# Altium footprint library B38.PcbLib: 42 footprints (part 2 of 3)
Each footprint in its own frame and in the unit in brackets; x right, y up, seen from the top. Pads: shape width x height; smd on the part's side, far side on the other; paste and mask are expansions set on the pad; w line width, h text height; cw(c..) or ccw(c..) is an arc to the next point about the centre after c.
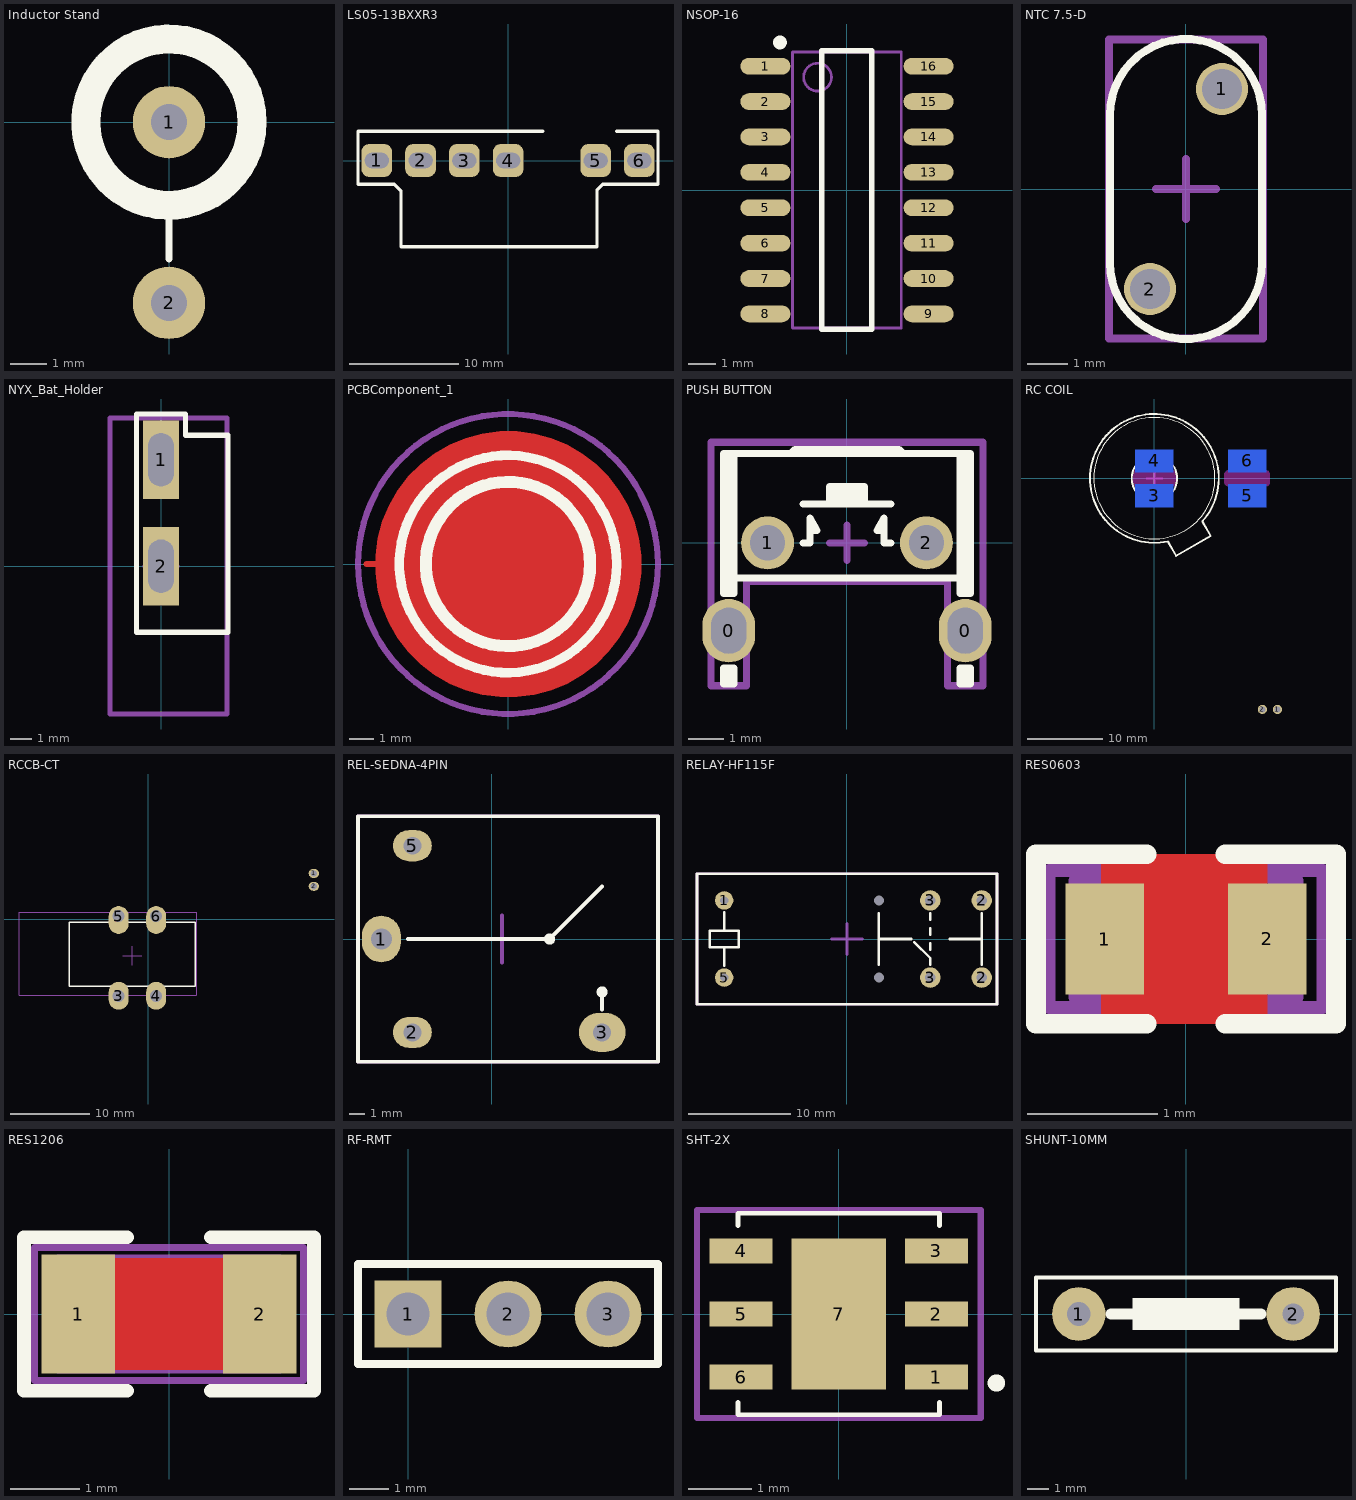
[diagram p1: the footprints below, top view; thin cyan lines are the x and y axes]

## Inductor Stand [mm]
pads (2):
  round 2 hole 1: 1(0,0) 2(0,-5)
Top Overlay:
  circle w0.8: c0,0 r2.3
  lines w0.2: 0,-3.785 0,-2.3

## LS05-13BXXR3 [mm]
pads (6):
  rrect50% 2.8x3 hole 1.4 slot 2.2 at 0 deg: 1(-12,0.005) 2(-8,0.005) 3(-4,-0.005) 4(0,-0.005) 5(8,-0.005) 6(12,-0.005)
Top Overlay:
  lines w0.3: 3.2,2.667 -13.716,2.667 -13.716,-2.159 -10.414,-2.159 -9.779,-2.794 -9.779,-7.874 8.128,-7.874 8.128,-2.667 8.636,-2.159 13.7,-2.159 13.7,2.667 9.9,2.667
3D body "PCB1.step": height 14.93, standoff -2.68, extent -13.287,-7.715 13.081,2.635

## NSOP-16 [mm]
pads (16):
  oval 1.8x0.6 smd: 1(-2.921,4.445) 2(-2.921,3.175) 3(-2.921,1.905) 4(-2.921,0.635) 5(-2.921,-0.635) 6(-2.921,-1.905) 7(-2.921,-3.175) 8(-2.921,-4.445) 9(2.933,-4.445) 10(2.932,-3.175) 11(2.933,-1.905) 12(2.933,-0.635) 13(2.933,0.635) 14(2.933,1.905) 15(2.932,3.175) 16(2.933,4.445)
Top Overlay:
  circle w0.25: c-2.399,5.295 r0.125
  lines w0.2: -0.9,-5 -0.9,5 0.901,5 0.901,-5 -0.9,-5
Mechanical 13:
  circle w0.1: c-1.05,4.05 r0.5
  lines w0.1: -1.95,-4.95 -1.95,4.95 1.95,4.95 1.95,-4.95 -1.95,-4.95
3D body "User Library-so16.STEP": height 1.7, standoff 0, extent -3.05,-5.125 2.95,5.075

## NTC 7.5-D [mm]
pads (2):
  round 1.3 / inner round 1.2 / far side oval 1.7x2 hole 1 mask+0.051: 1(0.9,2.5) 2(-0.9,-2.5)
Top Overlay:
  lines w0.2: -1.9,-1.85 ccw(c0,-1.85) 1.9,-1.85 1.9,1.85 ccw(c0,1.85) -1.9,1.85 -1.9,-1.8
Mechanical 15:
  lines w0.2: -0.75,0 0.75,0 ; 0,-0.75 0,0.75 ; -1.926,-3.743 -1.926,3.742 1.926,3.742 1.926,-3.743 -1.926,-3.743
3D body "Disk Varistor D7,5mm P5mm W4,5mm.stp": height 10.75, standoff -3.2, extent -1.926,-3.743 1.926,3.742

## NYX_Bat_Holder [mm]
height 2
pads (2):
  rect 1.7x3.7 / inner oval 1.7x3 / far side oval 2.3x3.6 hole 1.2 slot 2.5 at 90 deg: 1(0,5) 2(0,0)
Top Overlay:
  lines w0.25: -1.15,-3.1 -1.15,7.15 1.15,7.15 1.15,6.15 3.15,6.15 3.15,-3.1 -1.15,-3.1
Mechanical 15:
  lines w0.25: -0.75,0 0.75,0 ; 0,-0.75 0,0.75 ; -2.4,-6.948 3.1,-6.948 3.1,6.959 -2.4,6.959 -2.4,-6.948
3D body "BAT Holder_V5.step": height 15.5, standoff 0.51, extent -2.4,-6.948 3.1,6.959

## PCBComponent_1 [mm]
height 1.35
Top Layer:
  pour cut-out: -5.48,-0.008 -5.48,-0.369 -5.386,-1.083 -5.199,-1.779 -4.923,-2.444 -4.563,-3.068 -4.125,-3.639 -3.615,-4.149 -3.044,-4.587 -2.42,-4.947 -1.755,-5.223 -1.059,-5.41 -0.345,-5.504 0.376,-5.504 1.09,-5.41 1.786,-5.223 2.451,-4.947 3.075,-4.587 3.647,-4.149 4.156,-3.639 4.594,-3.068 4.955,-2.444 5.23,-1.779 5.417,-1.083 5.511,-0.369 5.511,-0.008 5.511,0.352 5.417,1.066 5.23,1.762 4.955,2.427 4.594,3.051 4.156,3.623 3.647,4.132 3.075,4.57 2.451,4.931 1.786,5.206 1.09,5.393 0.376,5.487 -0.345,5.487 -1.059,5.393 -1.755,5.206 -2.42,4.931 -3.044,4.57 -3.615,4.132 -4.125,3.623 -4.563,3.051 -4.923,2.427 -5.199,1.762 -5.386,1.066 -5.48,0.352
  pour cut-out: -4.425,0.35 -4.446,0.059 -4.412,-0.523 -4.303,-1.095 -4.119,-1.649 -3.865,-2.173 -3.545,-2.66 -3.164,-3.101 -2.728,-3.489 -2.246,-3.816 -1.725,-4.078 -1.174,-4.269 -0.603,-4.387 -0.022,-4.429 0.56,-4.396 1.133,-4.286 1.686,-4.103 2.211,-3.848 2.698,-3.528 3.139,-3.147 3.526,-2.711 3.854,-2.229 4.115,-1.708 4.307,-1.157 4.425,-0.586 4.446,-0.296 4.467,-0.005 4.433,0.577 4.323,1.149 4.14,1.703 3.886,2.228 3.566,2.715 3.184,3.156 2.749,3.543 2.267,3.871 1.746,4.132 1.195,4.324 0.624,4.441 0.043,4.484 -0.539,4.45 -1.112,4.34 -1.665,4.157 -2.19,3.903 -2.677,3.582 -3.118,3.201 -3.506,2.766 -3.833,2.283 -4.095,1.762 -4.286,1.212 -4.404,0.641
  lines w0.254: -5.85,0 -5.84,0 -5.582,0 -5.51,0 -5.383,0 -5.311,0 -5.235,0 -5.036,0 -1.5,0 ; 0,0 -1.5,0 ; -1.5,0 -1.5,0 ; -1.5,0 -1.5,0
  lines w4: -1.5,0 cw(c0,0) 0,-1.5 cw(c0,0) -1.5,0
Bottom Layer:
  pour cut-out: -5.2,0 -5.2,-0.341 -5.112,-1.017 -4.936,-1.675 -4.676,-2.305 -4.335,-2.896 -3.921,-3.437 -3.439,-3.919 -2.899,-4.335 -2.309,-4.676 -1.679,-4.937 -1.021,-5.114 -0.345,-5.204 0.337,-5.204 1.013,-5.116 1.671,-4.94 2.301,-4.68 2.892,-4.339 3.433,-3.925 3.915,-3.443 4.331,-2.903 4.672,-2.313 4.933,-1.683 5.11,-1.025 5.2,-0.349 5.2,-0.008 5.2,0 5.2,0.341 5.11,1.017 4.933,1.675 4.672,2.304 4.331,2.894 3.915,3.435 3.433,3.917 2.892,4.331 2.301,4.671 1.671,4.932 1.013,5.108 0.337,5.196 -0.345,5.196 -1.021,5.106 -1.679,4.929 -2.309,4.668 -2.899,4.326 -3.439,3.911 -3.921,3.429 -4.335,2.887 -4.676,2.297 -4.936,1.667 -5.112,1.008 -5.2,0.332 -5.2,-0.008
Top Overlay:
  circle w0.4: c0,0 r4.5
  circle w0.5: c0,0 r3.4
Bottom Paste:
  lines w0.9: -2.415,-0.647 ccw(c0,0) -0.647,-2.415 ; -2.415,0.647 cw(c0,0) -0.647,2.415 ; 0.647,-2.415 ccw(c0,0) 2.415,-0.647 ; 0.647,2.415 cw(c0,0) 2.415,0.647
Bottom Solder:
  circle w1: c0,0 r2.5
Mechanical 15:
  circle w0.254: c0,0 r6.21
  lines w0.254: -0.6,0 0.6,0 ; 0,-0.6 0,0.6
3D body "Spring.STEP": height 10.46, standoff -0.05, extent -5.242,-4.996 4.834,5.036

## PUSH BUTTON [mm]
pads (4):
  oval 1.5x1.8 / inner oval 1.5x1.8 / far side oval 2x2.3 hole 1 slot 1.3 at 90 deg mask+0.051: 0(-3.35,-2.49) 0(3.35,-2.49)
  round 1.5 / inner round 1.5 / far side oval 2x1.6 hole 1 mask+0.051: 1(-2.25,0) 2(2.25,0)
Top Overlay:
  rectangle: 3.2,-1.43 3.5,-0.98
  rectangle: -3.5,-1.43 -3.2,-0.98
  rectangle: 3.2,-4 3.5,-3.55
  rectangle: -3.5,-4 -3.2,-3.55
  region: 3.5,2.525 3.1,2.525 3.1,-0.95 3.5,-0.95
  rectangle: -3.5,-0.95 -3.1,2.525
  rectangle: -0.5,1.1 0.5,1.6
  lines w0.2: -1.6,2.525 -1.475,2.65 1.475,2.65 1.6,2.525 ; -1.25,0 -1.05,0 -1.05,0.7 -0.85,0.35 -1.05,0.35 ; -1.25,1.1 1.25,1.1 ; -0.5,1.1 -0.5,1.6 0.5,1.6 0.5,1.1 ; 1.05,0.35 0.85,0.35 1.05,0.7 1.05,0 1.25,0 ; -3.2,-4 -3.2,-3.55 ; -3.2,-4 -3.5,-4 -3.5,-3.55 -3.2,-3.55 ; -3.2,-4 -3.2,-3.55 ; -3.2,-1.43 -3.2,-0.98 ; -3.2,-1.43 -3.2,-0.98 ; -3.2,-1.43 -3.5,-1.43 -3.5,-0.98 -3.2,-0.98 ; 3.5,-4 3.5,-3.55 ; 3.5,-4 3.2,-4 3.2,-3.55 3.5,-3.55 ; 3.5,-4 3.5,-3.55 ; 3.5,-1.43 3.5,-0.98 ; 3.5,-1.43 3.5,-0.98 ; 3.5,-1.43 3.2,-1.43 3.2,-0.98 3.5,-0.98 ; -3.5,-1 3.5,-1 3.5,2.525 -3.5,2.525 -3.5,-1
Mechanical 15:
  lines w0.2: -0.5,0 0.5,0 ; 0,-0.5 0,0.5 ; -3.85,-4.05 -2.85,-4.05 -2.85,-1.1 2.85,-1.1 2.85,-4.05 3.85,-4.05 3.85,2.85 -3.85,2.85 -3.85,-4.05
3D body "SW-RA-3.15.stp": height 7.12, standoff -3.48, extent -4.109,-4.002 4.109,3.15

## RC COIL [mm]
pads (6):
  round 1.2 / inner oval 1.3x1.8 / far side oval 1.3x1.8 hole 0.8: 1(16.243,-30.514) 2(14.257,-30.514)
  rect 5x3 smd far side: 3(0,-2.3) 4(0,2.3) 5(12.25,-2.3) 6(12.25,2.3)
Top Overlay:
  circle w0.15: c0,0.026 r8
  circle w0.254: c0,0 r3
  lines w0.254: 1.767,-8.314 cw(c0,0) 6.317,-5.688 ; 1.799,-8.369 2.875,-10.233 7.425,-7.607 6.346,-5.737
Keep-Out Layer:
  board cut-out: 9.25,-0.55 9.25,0.55 9.25,0.65 9.326,0.833 9.467,0.974 9.65,1.05 9.75,1.05 14.75,1.05 14.85,1.05 15.033,0.974 15.174,0.833 15.25,0.65 15.25,0.55 15.25,-0.55 15.25,-0.65 15.174,-0.833 15.033,-0.974 14.85,-1.05 14.75,-1.05 9.75,-1.05 9.65,-1.05 9.467,-0.974 9.326,-0.833 9.25,-0.65
  board cut-out: -3,-0.55 -3,0.55 -3,0.65 -2.924,0.833 -2.783,0.974 -2.6,1.05 -2.5,1.05 2.5,1.05 2.6,1.05 2.783,0.974 2.924,0.833 3,0.65 3,0.55 3,-0.55 3,-0.65 2.924,-0.833 2.783,-0.974 2.6,-1.05 2.5,-1.05 -2.5,-1.05 -2.6,-1.05 -2.783,-0.974 -2.924,-0.833 -3,-0.65
Keep-Out Layer:
  lines w1: -2.5,-0.55 2.5,-0.55 2.5,0.55 -2.5,0.55 -2.5,-0.55 ; 9.75,-0.55 14.75,-0.55 14.75,0.55 9.75,0.55 9.75,-0.55
Mechanical 15:
  lines w0.254: -1,0 1,0 ; 0,-1 0,1
3D body "Current Transformer2.stp": height 8.42, standoff -0.82, extent -10.547,-34.497 24.392,10.55
3D body "PCB_CT_V.2.step": height 13, standoff -1.5, extent -3.396,-1.091 15.496,1

## RCCB-CT [mm]
pads (6):
  oval 1.3x1.1 hole 0.8: 1(20.762,5.764) 2(20.762,4.145)
  oval 2.5x3.5 hole 1.5: 3(-3.708,-9.575) 4(0.991,-9.574)
  oval 2.5x3.5 hole 1.5 copper offset 0,-0.5: 5(-3.708,0.426) 6(0.991,0.426)
Top Overlay:
  lines w0.2: -9.909,-1.974 -9.909,-0.375 -6.809,-0.375 ; -9.909,-1.944 -9.909,-7.674 -9.909,-8.374 ; -8.639,-0.375 5.891,-0.375 5.891,-1.974 ; -6.709,-8.374 -9.309,-8.374 -9.909,-8.374 ; -3.309,-8.374 -0.709,-8.374 ; -3.209,-0.375 -0.809,-0.375 ; 5.891,-1.944 5.891,-7.674 5.891,-8.374 5.291,-8.374 -9.909,-8.374
Mechanical 15:
  lines w0.1: -3.209,-4.574 -0.809,-4.575 ; -2.009,-5.774 -2.009,-3.374 ; -16.209,-9.527 5.991,-9.527 5.991,0.887 -16.209,0.887 -16.209,-9.527
3D body "rc coil vertical2.stp": height 15.49, standoff -0.8, extent -15.659,-9.352 5.704,0.723

## REL-SEDNA-4PIN [mm]
height 1.11
pads (4):
  oval 2.5x3 hole 1.35: 1(-7.1,0)
  oval 2.5x2 hole 1.15: 2(-5.1,-6) 5(-5.1,6)
  oval 3x2.5 hole 1.15: 3(7.1,-6)
Top Overlay:
  circle w0.254: c7.1,-3.406 r0.227
  circle w0.254: c3.72,-0.002 r0.227
  lines w0.254: -5.4,0 3.276,0 ; 3.376,0 3.821,0 ; 3.721,0 7.1,3.379 ; 7.1,-4.549 7.1,-3.379 ; -8.595,-7.891 10.691,-7.891 10.691,7.894 -8.595,7.894 -8.595,-7.891
Mechanical 15:
  lines w0.254: -0.85,0 0.65,0 ; 0.65,-1.5 0.65,0 ; 0.65,1.5 0.65,0 ; 2.15,0 0.65,0 ; -8.595,-7.891 -8.595,7.894 10.691,7.894 10.691,-7.891 -8.595,-7.891
3D body "4pin sedna.stp": height 1.7, standoff -16.01, extent -8.45,-7.75 10.55,7.75

## RELAY-HF115F [mm]
pads (8):
  round 0 hole 1: 0(3.14,-3.78) 0(3.14,3.78)
  round 1.8 hole 0.8: 1(-12.02,3.78) 5(-12.02,-3.78)
  round 2 hole 1: 2(13.22,-3.78) 2(13.22,3.78) 3(8.18,-3.78) 3(8.18,3.78)
Top Overlay:
  lines w0.25: 3.132,0 6.3,0 ; 6.6,-0.3 8.188,-1.888 8.188,-2.5 ; 8.188,-1.037 8.188,-0.425 ; 8.188,0.427 8.188,1.039 ; 8.188,1.89 8.188,2.502 ; 10.06,0 13.228,0 ; -13.452,-0.8 -13.452,0.8 -10.588,0.8 -10.588,-0.8 -13.452,-0.8
  lines w0.254: -12.017,-2.6 -12.017,-0.8 ; -12.017,0.8 -12.017,2.6 ; 3.132,-2.5 3.132,2.5 ; 13.228,-2.5 13.228,2.5 ; -14.688,-6.4 14.712,-6.4 14.712,6.4 -14.688,6.4 -14.688,-6.4
Mechanical 15:
  lines w0.254: -14.688,-6.4 -14.688,6.4 14.712,6.4 14.712,-6.4 -14.688,-6.4
  lines w0.3: -1.488,0 1.512,0 ; 0.012,-1.5 0.012,1.5
3D body "hf115f-h.stp": height 14.9, standoff -4.7, extent -14.488,-6.25 14.512,6.35

## RES0603 [mm]
pads (2):
  rect 0.6x0.85 smd: 1(-0.622,0) 2(0.622,0)
Top Layer:
  pour cut-out: -0.65,0.65 -0.65,-0.65 0.622,-0.65 0.622,0.65
Top Overlay:
  lines w0.15: -0.3,-0.65 -1.15,-0.65 -1.15,0.65 -0.3,0.65 ; 0.3,-0.65 1.15,-0.65 1.15,0.65 0.3,0.65
Mechanical 13:
  lines w0.1: -0.85,-0.45 0.85,-0.45 0.85,0.45 -0.85,0.45 -0.85,-0.45
Mechanical 15:
  lines w0.1: -0.2,0 0.2,0 ; 0,-0.2 0,0.2 ; -1.05,-0.525 1.05,-0.525 1.05,0.525 -1.05,0.525 -1.05,-0.525
3D body "0603.STEP": height 0.45, standoff 0, extent -0.762,-0.381 0.762,0.381

## RES1206 [mm]
height 2
pads (2):
  rect 1.05x1.7 smd: 1(-1.3,0) 2(1.3,0)
Top Layer:
  pour cut-out: -1.6,0.8 1.6,0.8 1.6,-0.8 -1.6,-0.8
Top Overlay:
  lines w0.2: -0.6,-1.1 -2.08,-1.1 -2.08,1.1 -0.6,1.1 ; 0.6,-1.1 2.08,-1.1 2.08,1.1 0.6,1.1
Mechanical 13:
  lines w0.1: -1.6,-0.8 -1.6,0.8 1.6,0.8 1.6,-0.8 -1.6,-0.8
Mechanical 15:
  lines w0.1: -0.5,0 0.5,0 ; 0,-0.5 0,0.5 ; -1.93,-0.95 1.93,-0.95 1.93,0.95 -1.93,0.95 -1.93,-0.95
3D body "1206.STEP": height 0.6, standoff 0, extent -1.524,-0.762 1.524,0.762

## RF-RMT [mm] "Connector; Header; 3 Position"
pads (3):
  rect 1.7x1.7 hole 1.1: 1(0,0)
  round 1.7 hole 1.1: 2(2.54,0) 3(5.08,0)
Top Overlay:
  lines w0.2: -1.27,-1.27 -1.27,1.27 6.35,1.27 6.35,-1.27 -1.27,-1.27
3D body: height 11, standoff 0.2, extent -1.345,0.032 10.911,3.969

## SHT-2X [mm]
height 2
pads (7):
  rect 1x0.4 smd: 1(1.55,-1) 2(1.55,0) 3(1.55,1) 4(-1.55,1) 5(-1.55,0) 6(-1.55,-1)
  rect 1.5x2.4 smd: 7(0,0)
Top Overlay:
  circle w0.254: c2.5,-1.093 r0.01
  lines w0.076: -1.6,-1.4 -1.6,-1.6 1.6,-1.6 1.6,-1.4 ; -1.6,1.4 -1.6,1.6 1.6,1.6 1.6,1.4
Mechanical 15:
  lines w0.1: -0.6,0 0.6,0 ; 0,-0.6 0,0.6 ; -2.25,-1.65 -2.25,1.65 2.25,1.65 2.25,-1.65 -2.25,-1.65
3D body "User Library-sensore_SHT21.STEP": height 1.1, standoff -0.02, extent -1.51,-1.5 1.51,1.5

## SHUNT-10MM [mm]
pads (2):
  round 2.5 hole 1.1: 1(-5,0)
  round 2.5 hole 1: 2(5,0)
Top Overlay:
  rectangle: -2.5,-0.75 2.5,0.75
  lines w0.203: -7,-1.7 -7,1.7 7,1.7 7,-1.7 -7,-1.7
  lines w0.5: -3.5,0 -2,0 ; 2,0 3.5,0
3D body "Shunt.STEP": height 11.5, standoff -3.85, extent -6.875,-1.5 6.875,1.5